# Altium footprint library ic.PcbLib: 108 footprints (part 7 of 7)
Each footprint in its own frame and in the unit in brackets; x right, y up, seen from the top. Pads: shape width x height; smd on the part's side, far side on the other; paste and mask are expansions set on the pad; w line width, h text height; cw(c..) or ccw(c..) is an arc to the next point about the centre after c.
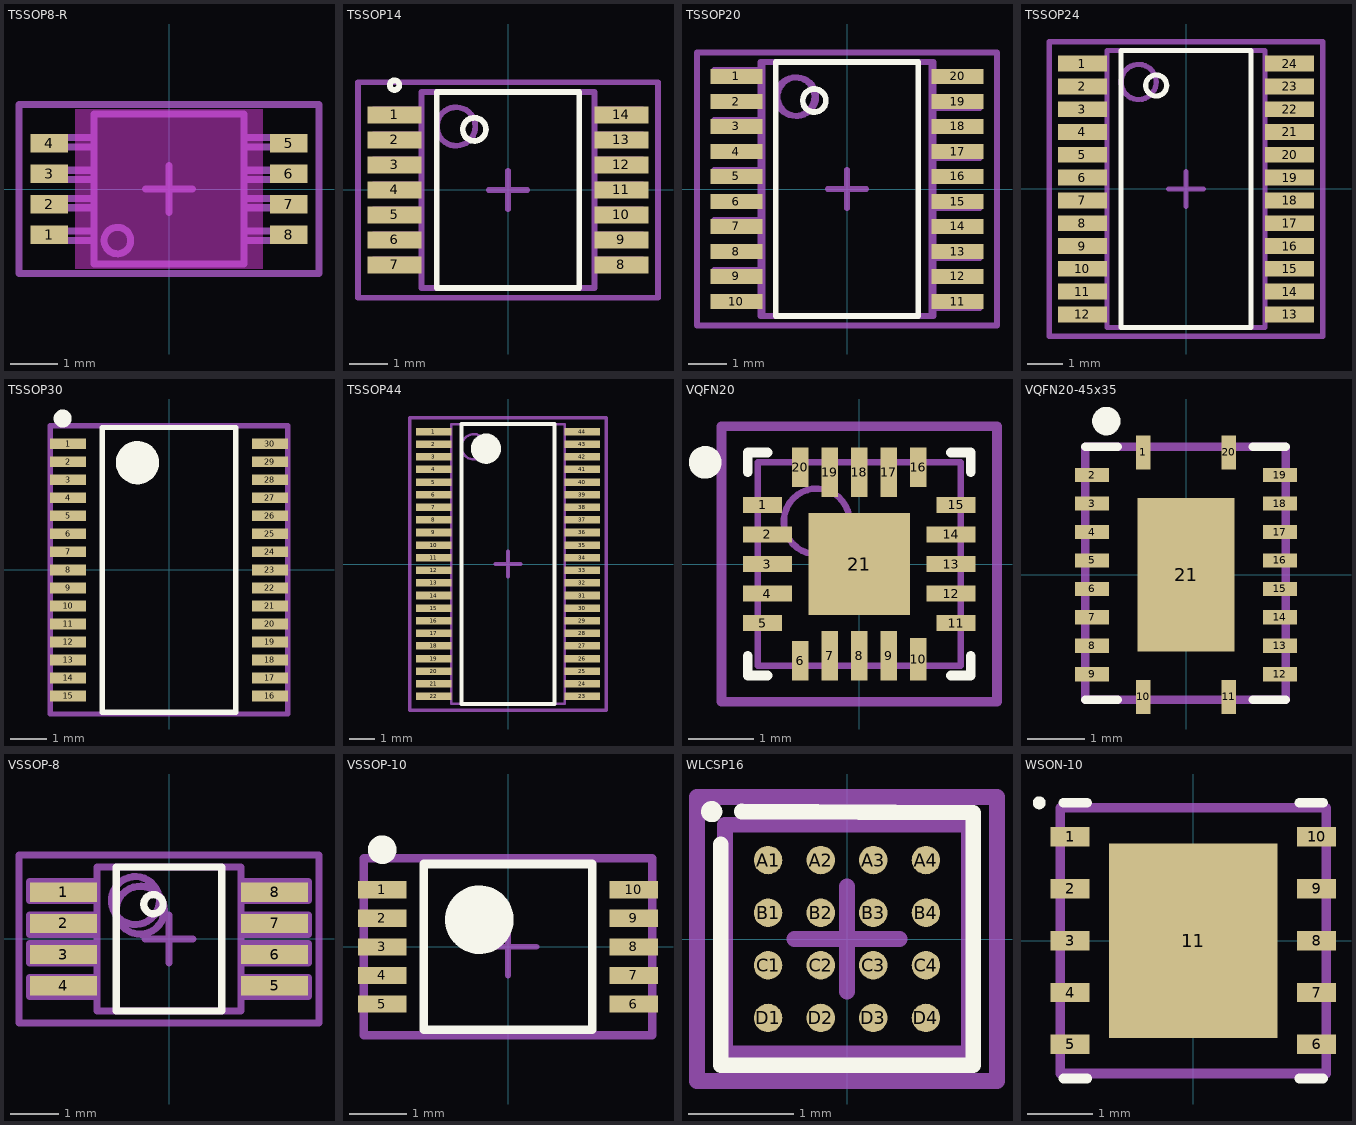
[diagram p6: the footprints below, top view; thin cyan lines are the x and y axes]

## TSSOP8-R [mm]
height 1.1
pads (8):
  rect 0.8x0.4 smd: 1(-2.55,-0.975) 2(-2.55,-0.325) 3(-2.55,0.325) 4(-2.55,0.975) 5(2.55,0.975) 6(2.55,0.325) 7(2.55,-0.325) 8(2.55,-0.975)
Top Overlay:
  text "." at -2.6,-1.6 h0.1
Keep-Out Layer:
  board cut-out: -2,1.7 2,1.7 2,-1.7 -2,-1.7
Top Courtyard:
  lines w0.15: -0.5,0 0.5,0 ; 0,-0.5 0,0.5 ; -3.2,-1.8 -3.2,1.8 3.2,1.8 3.2,-1.8 -3.2,-1.8
Mechanical 29:
  circle w0.15: c-1.1,-1.1 r0.283
  lines w0.15: -2.6,-1.1 -2.6,-0.9 -1.6,-0.9 -1.6,-1.1 -2.6,-1.1 ; -2.6,-0.4 -2.6,-0.2 -1.6,-0.2 -1.6,-0.4 -2.6,-0.4 ; -2.6,0.2 -2.6,0.4 -1.6,0.4 -1.6,0.2 -2.6,0.2 ; -2.6,0.9 -1.6,0.9 -1.6,1.1 -2.6,1.1 -2.6,0.9 ; -1.6,-1.6 -1.6,1.6 1.6,1.6 1.6,-1.6 -1.6,-1.6 ; 1.6,-1.1 2.6,-1.1 2.6,-0.9 1.6,-0.9 1.6,-1.1 ; 1.6,-0.4 2.6,-0.4 2.6,-0.2 1.6,-0.2 1.6,-0.4 ; 1.6,0.2 2.6,0.2 2.6,0.4 1.6,0.4 1.6,0.2 ; 1.6,0.9 2.6,0.9 2.6,1.1 1.6,1.1 1.6,0.9
  text ".Designator" at -1.4,-0.4 h1
3D body "tssop8.STEP": height 0.25, standoff -0.65, extent -2.528,-1.6 2.528,1.6

## TSSOP14 [mm] "TSOP, 14-Leads, Body 5,00x4,40mm, Pitch 0,65mm, IPC Medium Density"
height 1.1
pads (14):
  rect 1.4x0.45 smd: 1(-2.95,1.95) 2(-2.95,1.3) 3(-2.95,0.65) 4(-2.95,0) 5(-2.95,-0.65) 6(-2.95,-1.3) 7(-2.95,-1.95) 8(2.95,-1.95) 9(2.95,-1.3) 10(2.95,-0.65) 11(2.95,0) 12(2.95,0.65) 13(2.95,1.3) 14(2.95,1.95)
Top Overlay:
  circle w0.15: c-0.875,1.575 r0.3
  circle w0.15: c-2.95,2.725 r0.125
  lines w0.15: -1.85,-2.55 1.85,-2.55 1.85,2.55 -1.85,2.55 -1.85,-2.55
Top Courtyard:
  lines w0.15: -0.5,0 0.5,0 ; 0,-0.5 0,0.5 ; -3.9,-2.8 3.9,-2.8 3.9,2.8 -3.9,2.8 -3.9,-2.8
Mechanical 29:
  circle w0.15: c-1.35,1.65 r0.5
  lines w0.15: -2.25,-2 -3.5,-2 -3.5,-1.8 -2.25,-1.8 ; -2.25,-1.35 -3.5,-1.35 -3.5,-1.15 -2.25,-1.15 ; -2.25,-0.7 -3.5,-0.7 -3.5,-0.5 -2.25,-0.5 ; -2.25,-0.05 -3.5,-0.05 -3.5,0.15 -2.25,0.15 ; -2.25,0.6 -3.5,0.6 -3.5,0.8 -2.25,0.8 ; -2.25,1.25 -3.5,1.25 -3.5,1.45 -2.25,1.45 ; -2.25,1.9 -3.5,1.9 -3.5,2.1 -2.25,2.1 ; 2.25,-2 3.5,-2 3.5,-1.8 2.25,-1.8 ; 2.25,-1.35 3.5,-1.35 3.5,-1.15 2.25,-1.15 ; 2.25,-0.7 3.5,-0.7 3.5,-0.5 2.25,-0.5 ; 2.25,-0.05 3.5,-0.05 3.5,0.15 2.25,0.15 ; 2.25,0.6 3.5,0.6 3.5,0.8 2.25,0.8 ; 2.25,1.25 3.5,1.25 3.5,1.45 2.25,1.45 ; 2.25,1.9 3.5,1.9 3.5,2.1 2.25,2.1 ; -2.25,-2.55 2.25,-2.55 2.25,2.55 -2.25,2.55 -2.25,-2.55
  text ".Designator" at -3,3.1 h1

## TSSOP20 [mm] "TSSOP, 20-Leads, Body 6,50x4,40mm, Pitch 0,65mm, IPC Medium Density"
height 1.2
pads (20):
  rect 1.35x0.4 smd: 1(-2.875,2.925) 2(-2.875,2.275) 3(-2.875,1.625) 4(-2.875,0.975) 5(-2.875,0.325) 6(-2.875,-0.325) 7(-2.875,-0.975) 8(-2.875,-1.625) 9(-2.875,-2.275) 10(-2.875,-2.925) 11(2.875,-2.925) 12(2.875,-2.275) 13(2.875,-1.625) 14(2.875,-0.975) 15(2.875,-0.325) 16(2.875,0.325) 17(2.875,0.975) 18(2.875,1.625) 19(2.875,2.275) 20(2.875,2.925)
Top Overlay:
  circle w0.15: c-0.85,2.3 r0.3
  lines w0.15: -1.85,-3.3 -1.85,3.3 1.85,3.3 1.85,-3.3 -1.85,-3.3
  text "." at -2.9,3.6 h0.1
Top Courtyard:
  lines w0.15: -0.5,0 0.5,0 ; 0,-0.5 0,0.5 ; -3.9,-3.55 -3.9,3.55 3.9,3.55 3.9,-3.55 -3.9,-3.55
Mechanical 13:
  circle w0.15: c-1.35,2.4 r0.5
  lines w0.15: -2.25,-3.3 -2.25,3.3 2.25,3.3 2.25,-3.3 -2.25,-3.3
Mechanical 29:
  circle w0.15: c-1.3,2.4 r0.5
  lines w0.15: -2.2,-3 -3.45,-3 -3.45,-2.8 -2.2,-2.8 ; -2.2,-2.3 -3.45,-2.3 -3.45,-2.1 -2.2,-2.1 ; -2.2,-1.7 -3.45,-1.7 -3.45,-1.5 -2.2,-1.5 ; -2.2,-1 -3.45,-1 -3.45,-0.8 -2.2,-0.8 ; -2.2,-0.4 -3.45,-0.4 -3.45,-0.2 -2.2,-0.2 ; -2.2,0.3 -3.45,0.3 -3.45,0.5 -2.2,0.5 ; -2.2,0.9 -3.45,0.9 -3.45,1.1 -2.2,1.1 ; -2.2,1.6 -3.45,1.6 -3.45,1.8 -2.2,1.8 ; -2.2,2.2 -3.45,2.2 -3.45,2.4 -2.2,2.4 ; -2.2,2.9 -3.45,2.9 -3.45,3.1 -2.2,3.1 ; 2.2,-3.1 3.45,-3.1 3.45,-2.9 2.2,-2.9 ; 2.2,-2.4 3.45,-2.4 3.45,-2.2 2.2,-2.2 ; 2.2,-1.8 3.45,-1.8 3.45,-1.6 2.2,-1.6 ; 2.2,-1.1 3.45,-1.1 3.45,-0.9 2.2,-0.9 ; 2.2,-0.5 3.45,-0.5 3.45,-0.3 2.2,-0.3 ; 2.2,0.2 3.45,0.2 3.45,0.4 2.2,0.4 ; 2.2,0.8 3.45,0.8 3.45,1 2.2,1 ; 2.2,1.5 3.45,1.5 3.45,1.7 2.2,1.7 ; 2.2,2.1 3.45,2.1 3.45,2.3 2.2,2.3 ; 2.2,2.8 3.45,2.8 3.45,3 2.2,3 ; -2.2,-3.3 -2.2,3.3 2.2,3.3 2.2,-3.3 -2.2,-3.3
  text ".Designator" at -3.3,3.6 h1
3D body "TSSOP-20.step": height 1.2, standoff 0, extent -3.2,-3.3 3.2,3.3

## TSSOP24 [mm] "TSOP, 24-Leads, Body 7,80x4,40mm, Pitch 0,65mm, IPC Medium Density"
height 1.1
pads (24):
  rect 1.4x0.45 smd: 1(-2.95,3.575) 2(-2.95,2.925) 3(-2.95,2.275) 4(-2.95,1.625) 5(-2.95,0.975) 6(-2.95,0.325) 7(-2.95,-0.325) 8(-2.95,-0.975) 9(-2.95,-1.625) 10(-2.95,-2.275) 11(-2.95,-2.925) 12(-2.95,-3.575) 13(2.95,-3.575) 14(2.95,-2.925) 15(2.95,-2.275) 16(2.95,-1.625) 17(2.95,-0.975) 18(2.95,-0.325) 19(2.95,0.325) 20(2.95,0.975) 21(2.95,1.625) 22(2.95,2.275) 23(2.95,2.925) 24(2.95,3.575)
Top Overlay:
  circle w0.15: c-0.85,2.95 r0.3
  lines w0.15: -1.85,-3.95 -1.85,3.95 1.85,3.95 1.85,-3.95 -1.85,-3.95
  text "." at -3,4.3 h0.1
Top Courtyard:
  lines w0.15: -0.5,0 0.5,0 ; 0,-0.5 0,0.5 ; -3.9,-4.2 -3.9,4.2 3.9,4.2 3.9,-4.2 -3.9,-4.2
Mechanical 29:
  circle w0.15: c-1.35,3.05 r0.5
  lines w0.15: -2.25,-3.7 -3.5,-3.7 -3.5,-3.5 -2.25,-3.5 ; -2.25,-3 -3.5,-3 -3.5,-2.8 -2.25,-2.8 ; -2.25,-2.4 -3.5,-2.4 -3.5,-2.2 -2.25,-2.2 ; -2.25,-1.7 -3.5,-1.7 -3.5,-1.5 -2.25,-1.5 ; -2.25,-1.1 -3.5,-1.1 -3.5,-0.9 -2.25,-0.9 ; -2.25,-0.4 -3.5,-0.4 -3.5,-0.2 -2.25,-0.2 ; -2.25,0.2 -3.5,0.2 -3.5,0.4 -2.25,0.4 ; -2.25,0.9 -3.5,0.9 -3.5,1.1 -2.25,1.1 ; -2.25,1.5 -3.5,1.5 -3.5,1.7 -2.25,1.7 ; -2.25,2.2 -3.5,2.2 -3.5,2.4 -2.25,2.4 ; -2.25,2.8 -3.5,2.8 -3.5,3 -2.25,3 ; -2.25,3.5 -3.5,3.5 -3.5,3.7 -2.25,3.7 ; 2.25,-3.7 3.5,-3.7 3.5,-3.5 2.25,-3.5 ; 2.25,-3 3.5,-3 3.5,-2.8 2.25,-2.8 ; 2.25,-2.4 3.5,-2.4 3.5,-2.2 2.25,-2.2 ; 2.25,-1.7 3.5,-1.7 3.5,-1.5 2.25,-1.5 ; 2.25,-1.1 3.5,-1.1 3.5,-0.9 2.25,-0.9 ; 2.25,-0.4 3.5,-0.4 3.5,-0.2 2.25,-0.2 ; 2.25,0.2 3.5,0.2 3.5,0.4 2.25,0.4 ; 2.25,0.9 3.5,0.9 3.5,1.1 2.25,1.1 ; 2.25,1.5 3.5,1.5 3.5,1.7 2.25,1.7 ; 2.25,2.2 3.5,2.2 3.5,2.4 2.25,2.4 ; 2.25,2.8 3.5,2.8 3.5,3 2.25,3 ; 2.25,3.5 3.5,3.5 3.5,3.7 2.25,3.7 ; -2.25,-3.95 -2.25,3.95 2.25,3.95 2.25,-3.95 -2.25,-3.95
  text ".Designator" at -2,-0.4 h1

## TSSOP30 [mm] "TSSOP, 30-Leads, Body 7,80x4,40mm, Pitch 0,50mm, IPC Medium Density"
height 1.2
pads (30):
  rect 1x0.3 smd: 1(-2.8,3.5) 2(-2.8,3) 3(-2.8,2.5) 4(-2.8,2) 5(-2.8,1.5) 6(-2.8,1) 7(-2.8,0.5) 8(-2.8,0) 9(-2.8,-0.5) 10(-2.8,-1) 11(-2.8,-1.5) 12(-2.8,-2) 13(-2.8,-2.5) 14(-2.8,-3) 15(-2.8,-3.5) 16(2.8,-3.5) 17(2.8,-3) 18(2.8,-2.5) 19(2.8,-2) 20(2.8,-1.5) 21(2.8,-1) 22(2.8,-0.5) 23(2.8,0) 24(2.8,0.5) 25(2.8,1) 26(2.8,1.5) 27(2.8,2) 28(2.8,2.5) 29(2.8,3) 30(2.8,3.5)
Top Overlay:
  circle w0.25: c-2.95,4.2 r0.125
  circle w0.6: c-0.875,2.975 r0.3
  lines w0.15: -1.85,-3.95 -1.85,3.95 1.85,3.95 1.85,-3.95 -1.85,-3.95
Top Courtyard:
  lines w0.15: -3.3,-4 -3.3,4 3.3,4 3.3,-4 -3.3,-4
3D body "TSSOP30.step": height 1.2, standoff 0, extent -3.2,-3.95 3.2,3.95

## TSSOP44 [mm] "TSSOP, 44-Leads, Body 11,00x4,40mm, Pitch 0,50mm, IPC Medium Density"
height 1.2
pads (44):
  rect 1.4x0.3 smd: 1(-2.95,5.25) 2(-2.95,4.75) 3(-2.95,4.25) 4(-2.95,3.75) 5(-2.95,3.25) 6(-2.95,2.75) 7(-2.95,2.25) 8(-2.95,1.75) 9(-2.95,1.25) 10(-2.95,0.75) 11(-2.95,0.25) 12(-2.95,-0.25) 13(-2.95,-0.75) 14(-2.95,-1.25) 15(-2.95,-1.75) 16(-2.95,-2.25) 17(-2.95,-2.75) 18(-2.95,-3.25) 19(-2.95,-3.75) 20(-2.95,-4.25) 21(-2.95,-4.75) 22(-2.95,-5.25) 23(2.95,-5.25) 24(2.95,-4.75) 25(2.95,-4.25) 26(2.95,-3.75) 27(2.95,-3.25) 28(2.95,-2.75) 29(2.95,-2.25) 30(2.95,-1.75) 31(2.95,-1.25) 32(2.95,-0.75) 33(2.95,-0.25) 34(2.95,0.25) 35(2.95,0.75) 36(2.95,1.25) 37(2.95,1.75) 38(2.95,2.25) 39(2.95,2.75) 40(2.95,3.25) 41(2.95,3.75) 42(2.95,4.25) 43(2.95,4.75) 44(2.95,5.25)
Top Overlay:
  circle w0.6: c-0.875,4.575 r0.3
  lines w0.15: -1.85,-5.55 -1.85,5.55 1.85,5.55 1.85,-5.55 -1.85,-5.55
  text "." at -3,5.9 h0.1
Top Courtyard:
  circle w0.1: c-1.35,4.65 r0.5
  lines w0.1: -2.25,-5.55 -2.25,5.55 2.25,5.55 2.25,-5.55 -2.25,-5.55
  lines w0.15: -0.5,0 0.5,0 ; 0,-0.5 0,0.5 ; -3.9,-5.8 3.9,-5.8 3.9,5.8 -3.9,5.8 -3.9,-5.8
3D body "TSSOP44.step": height 1.2, standoff 0, extent -3.2,-5.55 3.2,5.55

## VQFN20 [mm] "VQFN, 20-Leads, Body 3,00x3,00mm, Pitch 0,45mm, Thermal Pad 1,55x1,55mm, IPC Medium Density"
height 0.85
pads (21):
  rect 0.6x0.25 smd: 1(-1.475,0.9) 5(-1.475,-0.9) 11(1.475,-0.9) 15(1.475,0.9)
  rect 0.75x0.25 smd: 2(-1.4,0.45) 3(-1.4,0) 4(-1.4,-0.45) 12(1.4,-0.45) 13(1.4,0) 14(1.4,0.45)
  rect 0.25x0.6 smd: 6(-0.9,-1.475) 16(0.9,1.475) 20(-0.9,1.475)
  rect 0.25x0.75 smd: 7(-0.45,-1.4) 8(0,-1.4) 9(0.45,-1.4) 17(0.45,1.4) 18(0,1.4) 19(-0.45,1.4)
  rect 0.25x0.65 smd: 10(0.9,-1.45)
  rect 1.55x1.55 smd: 21(0,0)
Top Overlay:
  circle w0.25: c-2.35,1.55 r0.125
  lines w0.15: -1.7,-1.4 -1.7,-1.7 -1.4,-1.7 ; -1.7,1.4 -1.7,1.7 -1.4,1.7 ; 1.4,-1.7 1.7,-1.7 1.7,-1.4 ; 1.4,1.7 1.7,1.7 1.7,1.4
Top Courtyard:
  circle w0.1: c-0.65,0.65 r0.5
  lines w0.1: -1.55,-1.55 -1.55,1.55 1.55,1.55 1.55,-1.55 -1.55,-1.55
  lines w0.15: -0.5,0 0.5,0 ; 0,-0.5 0,0.5 ; -2.1,-2.1 2.1,-2.1 2.1,2.1 -2.1,2.1 -2.1,-2.1
3D body "VQFN20.step": height 0.85, standoff 0, extent -1.57,-1.57 1.57,1.57

## VQFN20-45x35 [mm] "VQFN, 20-Leads, Body 3,00x3,00mm, Pitch 0,45mm, Thermal Pad 1,55x1,55mm, IPC Medium Density"
height 0.85
pads (21):
  rect 0.25x0.6 smd: 1(-0.75,2.15) 10(-0.75,-2.15) 11(0.75,-2.15) 20(0.75,2.15)
  rect 0.6x0.25 smd: 2(-1.65,1.75) 3(-1.65,1.25) 4(-1.65,0.75) 5(-1.65,0.25) 6(-1.65,-0.25) 7(-1.65,-0.75) 8(-1.65,-1.25) 9(-1.65,-1.75) 12(1.65,-1.75) 13(1.65,-1.25) 14(1.65,-0.75) 15(1.65,-0.25) 16(1.65,0.25) 17(1.65,0.75) 18(1.65,1.25) 19(1.65,1.75)
  rect 1.7x2.7 smd: 21(0,0)
Top Overlay:
  circle w0.25: c-1.4,2.7 r0.125
  lines w0.15: -1.775,-2.2 -1.2,-2.2 ; -1.775,2.25 -1.2,2.25 ; 1.175,-2.2 1.75,-2.2 ; 1.175,2.25 1.75,2.25
Top Courtyard:
  lines w0.15: -0.5,0 0.5,0 ; 0,-0.5 0,0.5 ; -1.775,-2.2 -1.775,2.25 1.75,2.25 1.75,-2.2 -1.775,-2.2
3D body "RGY0020B.stp": height 1, standoff 0, extent -1.75,-2.25 1.75,2.25

## VSSOP-8 [mm] "TSOP, 8-Leads, Body 3,00x3,00mm, Pitch 0,65mm, IPC Medium Density"
height 1.1
pads (8):
  rect 1.4x0.4 smd: 1(-2.2,0.975) 2(-2.2,0.325) 3(-2.2,-0.325) 4(-2.2,-0.975) 5(2.2,-0.975) 6(2.2,-0.325) 7(2.2,0.325) 8(2.2,0.975)
Top Overlay:
  circle w0.15: c-0.325,0.725 r0.2
  lines w0.15: -1.1,-1.5 -1.1,1.5 1.1,1.5 1.1,-1.5 -1.1,-1.5
  text "." at -2.2,1.7 h0.1
Top Courtyard:
  lines w0.15: -0.5,0 0.5,0 ; 0,-0.5 0,0.5 ; -3.125,-1.75 -3.125,1.75 3.125,1.75 3.125,-1.75 -3.125,-1.75
Mechanical 13:
  circle w0.15: c-0.6,0.6 r0.5
  lines w0.15: -1.5,-1.5 -1.5,1.5 1.5,1.5 1.5,-1.5 -1.5,-1.5
Mechanical 29:
  circle w0.15: c-0.7,0.8 r0.5
  lines w0.15: -1.5,-1.2 -2.9,-1.2 -2.9,-0.8 -1.5,-0.8 ; -1.5,-0.5 -2.9,-0.5 -2.9,-0.1 -1.5,-0.1 ; -1.5,0.1 -2.9,0.1 -2.9,0.5 -1.5,0.5 ; -1.5,0.8 -2.9,0.8 -2.9,1.2 -1.5,1.2 ; 1.5,-1.2 2.9,-1.2 2.9,-0.8 1.5,-0.8 ; 1.5,-0.5 2.9,-0.5 2.9,-0.1 1.5,-0.1 ; 1.5,0.1 2.9,0.1 2.9,0.5 1.5,0.5 ; 1.5,0.8 2.9,0.8 2.9,1.2 1.5,1.2 ; -1.5,-1.5 1.5,-1.5 1.5,1.5 -1.5,1.5 -1.5,-1.5
  text ".Designator" at -2.7,2 h1
3D body "VSSOP-8.step": height 1.1, standoff 0, extent -2.45,-1.5 2.45,1.5

## VSSOP-10 [mm] "VSSOP, 10-Leads, Body 3,00x3,00mm, Pitch 0,50mm, IPC High Density"
height 1.1
pads (10):
  rect 0.85x0.3 smd: 1(-2.2,1) 2(-2.2,0.5) 3(-2.2,0) 4(-2.2,-0.5) 5(-2.2,-1) 6(2.2,-1) 7(2.2,-0.5) 8(2.2,0) 9(2.2,0.5) 10(2.2,1)
Top Overlay:
  circle w0.6: c-0.5,0.475 r0.3
  circle w0.25: c-2.2,1.7 r0.125
  lines w0.15: -1.475,-1.45 1.475,-1.45 1.475,1.45 -1.475,1.45 -1.475,-1.45
Top Courtyard:
  lines w0.1: -0.5,0 0.5,0 ; 0,-0.5 0,0.5
  lines w0.15: -2.525,-1.55 2.525,-1.55 2.525,1.55 -2.525,1.55 -2.525,-1.55
3D body "VSSOP-10.step": height 1.1, standoff 0, extent -2.45,-1.55 2.45,1.55

## WLCSP16 [mm] "BGA, 16-Leads, Body 2,32x2,17mmx0,60mm, Pitch 0,50mm"
height 0.6
pads (16):
  round 0.27 smd: A1(-0.75,0.75) A2(-0.25,0.75) A3(0.25,0.75) A4(0.75,0.75) B1(-0.75,0.25) B2(-0.25,0.25) B3(0.25,0.25) B4(0.75,0.25) C1(-0.75,-0.25) C2(-0.25,-0.25) C3(0.25,-0.25) C4(0.75,-0.25) D1(-0.75,-0.75) D2(-0.25,-0.75) D3(0.25,-0.75) D4(0.75,-0.75)
Top Overlay:
  circle w0.1: c-1.285,1.21 r0.05
  lines w0.15: -1.2,0.9 -1.2,-1.2 1.2,-1.2 1.2,1.2 -1,1.21
Top Courtyard:
  lines w0.15: -0.5,0 0.5,0 ; 0,-0.5 0,0.5 ; -1.425,-1.35 1.425,-1.35 1.425,1.35 -1.425,1.35 -1.425,-1.35
Mechanical 13:
  lines w0.15: -1.16,-1.085 1.16,-1.085 1.16,1.085 -1.16,1.085 -1.16,-1.085
3D body "WLCSP16.step": height 0.6, standoff 0, extent -1.16,-1.085 1.16,1.085

## WSON-10 [mm] "WSON, 10-Leads, Body 4,00x4,00mm, Pitch 0,80mm, Thermal Pad 3,00x2,60mm, IPC High Density"
height 0.8
pads (11):
  rect 0.6x0.3 smd: 1(-1.9,1.6) 2(-1.9,0.8) 3(-1.9,0) 4(-1.9,-0.8) 5(-1.9,-1.6) 6(1.9,-1.6) 7(1.9,-0.8) 8(1.9,0) 9(1.9,0.8) 10(1.9,1.6)
  rect 2.6x3 smd paste-1.3: 11(0,0)
Top Overlay:
  circle w0.1: c-2.375,2.125 r0.05
  lines w0.15: -2,-2.125 -1.635,-2.125 ; -2,2.125 -1.635,2.125 ; 1.635,-2.125 2,-2.125 ; 1.635,2.125 2,2.125
Top Paste:
  rectangle: 0.1,-1.4 1.2,-0.1
  rectangle: 0.1,0.1 1.2,1.4
  rectangle: -1.2,-1.4 -0.1,-0.1
  rectangle: -1.2,0.1 -0.1,1.4
Top Courtyard:
  lines w0.1: -0.5,0 0.5,0 ; 0,-0.5 0,0.5
  lines w0.15: -2.05,-2.05 2.05,-2.05 2.05,2.05 -2.05,2.05 -2.05,-2.05
3D body "WSON-10.step": height 0.8, standoff 0, extent -2.001,-2 2.001,2